# Altium footprint library tsl_Pcblib.PcbLib: 219 footprints (part 2 of 14)
Each footprint in its own frame and in the unit in brackets; x right, y up, seen from the top. Pads: shape width x height; smd on the part's side, far side on the other; paste and mask are expansions set on the pad; w line width, h text height; cw(c..) or ccw(c..) is an arc to the next point about the centre after c.
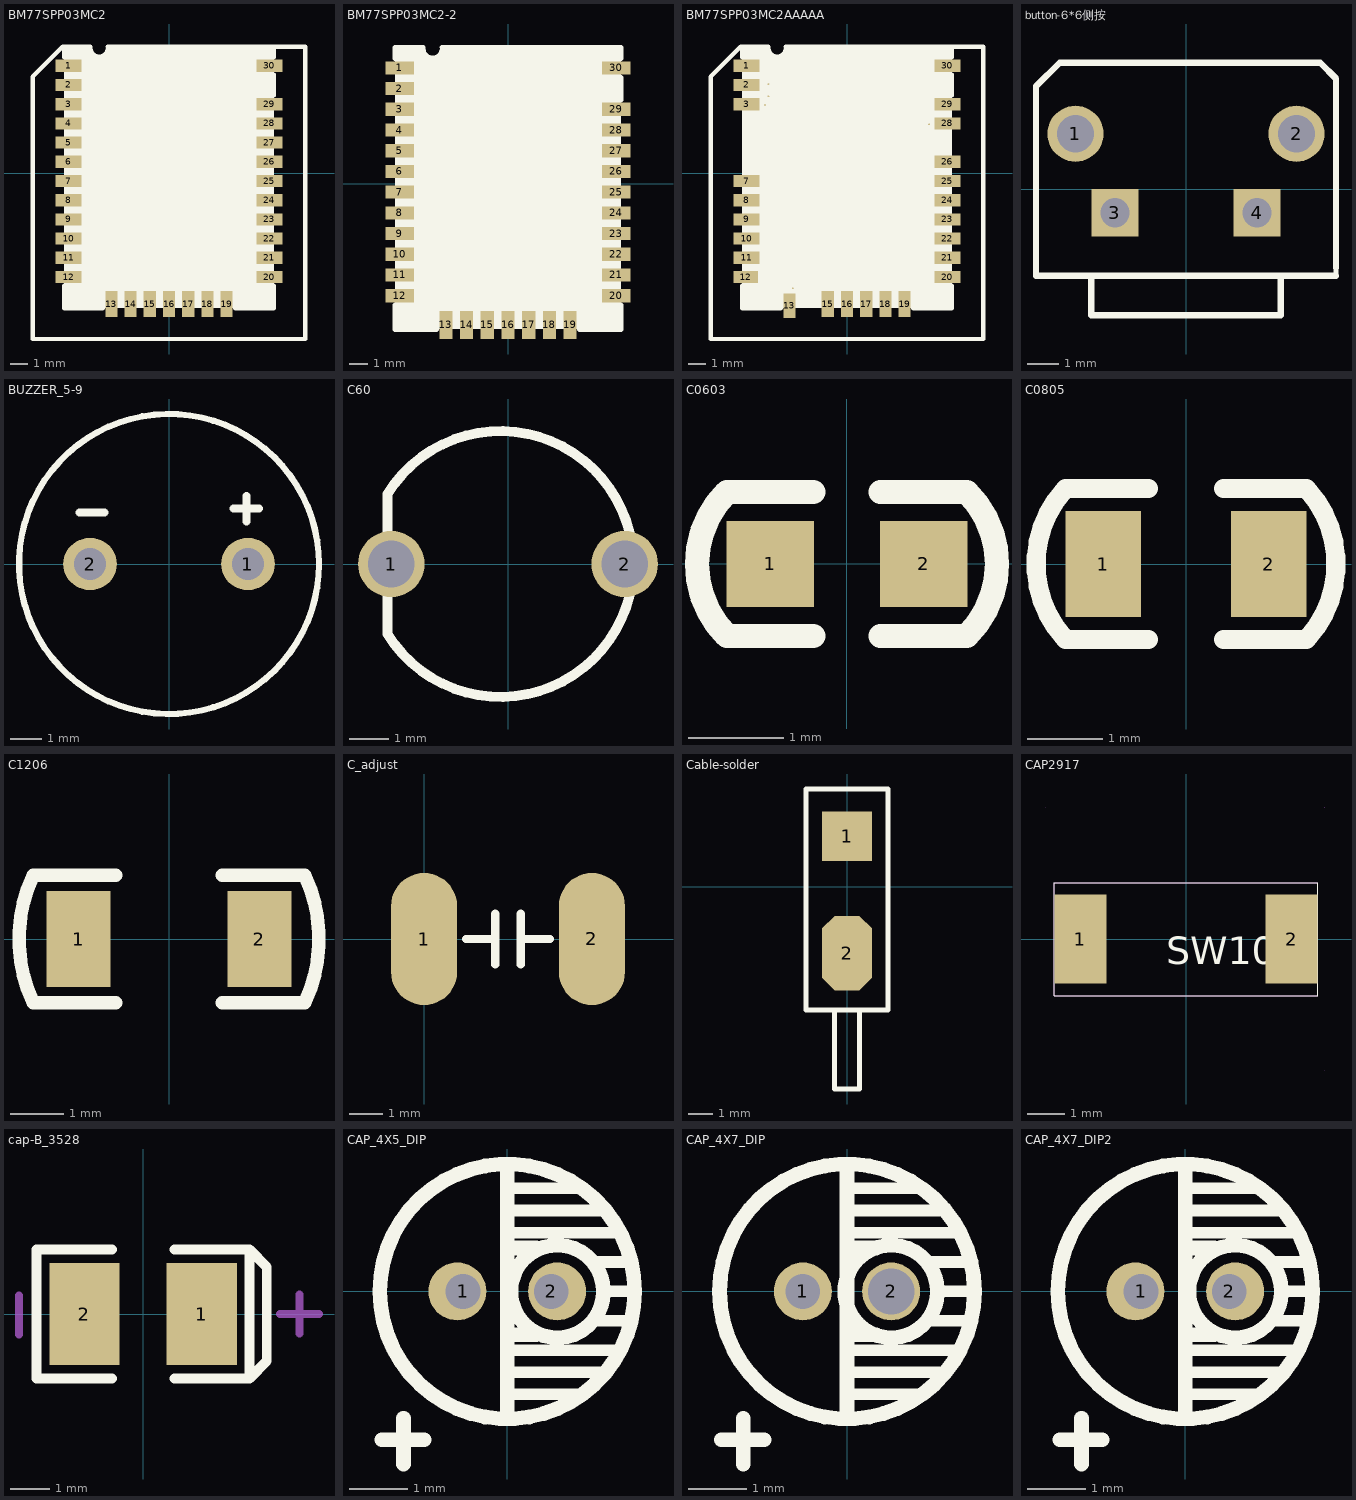
[diagram p1: the footprints below, top view; thin cyan lines are the x and y axes]

## BM77SPP03MC2 [mm]
pads (30):
  rect 1.5x0.7 smd: 1(-5.75,6.15) 2(-5.75,5.05) 3(-5.75,3.95) 4(-5.75,2.85) 5(-5.75,1.75) 6(-5.75,0.65) 7(-5.75,-0.45) 8(-5.75,-1.55) 9(-5.75,-2.65) 10(-5.75,-3.75) 11(-5.75,-4.85) 12(-5.75,-5.95) 20(5.75,-5.95) 21(5.75,-4.85) 22(5.75,-3.75) 23(5.75,-2.65) 24(5.75,-1.55) 25(5.75,-0.45) 26(5.75,0.65) 27(5.75,1.75) 28(5.75,2.85) 29(5.75,3.95) 30(5.75,6.15)
  rect 0.7x1.5 smd: 13(-3.3,-7.5) 14(-2.2,-7.5) 15(-1.1,-7.5) 16(0,-7.5) 17(1.1,-7.5) 18(2.2,-7.5) 19(3.3,-7.5)
Top Overlay:
  region: -6,7.3 -6,-7.7 6,-7.7 6,7.3 -3.496,7.301 -3.463,7.134 -3.504,6.928 -3.62,6.754 -3.794,6.637 -4,6.596 -4.206,6.637 -4.38,6.754 -4.496,6.928 -4.537,7.134 -4.504,7.301 -4.5,7.3
  lines w0.254: -6,-6.45 -6,-7.75 -3.8,-7.75 ; -6,6.65 -6,7.25 -4.5,7.25 ccw(c-4,7.18) -3.5,7.25 6,7.25 6,6.65 ; -5,7.25 -6.082,7.25 -7.8,5.532 -7.8,-9.5 7.8,-9.5 7.8,7.25 5,7.25 ; 3.8,-7.75 6,-7.75 6,-6.45 ; 6,4.45 6,5.65
3D body: height 2.2, standoff 0.2, extent -6.096,-7.747 6.223,7.113

## BM77SPP03MC2-2 [mm]
pads (30):
  rect 1.5x0.7 smd: 1(-5.75,6.15) 2(-5.75,5.05) 3(-5.75,3.95) 4(-5.75,2.85) 5(-5.75,1.75) 6(-5.75,0.65) 7(-5.75,-0.45) 8(-5.75,-1.55) 9(-5.75,-2.65) 10(-5.75,-3.75) 11(-5.75,-4.85) 12(-5.75,-5.95) 20(5.75,-5.95) 21(5.75,-4.85) 22(5.75,-3.75) 23(5.75,-2.65) 24(5.75,-1.55) 25(5.75,-0.45) 26(5.75,0.65) 27(5.75,1.75) 28(5.75,2.85) 29(5.75,3.95) 30(5.75,6.15)
  rect 0.7x1.5 smd: 13(-3.3,-7.5) 14(-2.2,-7.5) 15(-1.1,-7.5) 16(0,-7.5) 17(1.1,-7.5) 18(2.2,-7.5) 19(3.3,-7.5)
Top Overlay:
  region: -6,7.3 -6,-7.7 6,-7.7 6,7.3 -3.496,7.301 -3.463,7.134 -3.504,6.928 -3.62,6.754 -3.794,6.637 -4,6.596 -4.206,6.637 -4.38,6.754 -4.496,6.928 -4.537,7.134 -4.504,7.301 -4.5,7.3
  lines w0.254: -6,-6.45 -6,-7.75 -3.8,-7.75 ; -6,6.65 -6,7.25 -4.5,7.25 ccw(c-4,7.18) -3.5,7.25 6,7.25 6,6.65 ; 3.8,-7.75 6,-7.75 6,-6.45 ; 6,4.45 6,5.65
3D body: height 2.2, standoff 0.2, extent -6.096,-7.747 6.223,7.113

## BM77SPP03MC2AAAAA [mm]
pads (30):
  rect 1.5x0.7 smd: 1(-5.75,6.15) 2(-5.75,5.05) 3(-5.75,3.95) 7(-5.75,-0.45) 8(-5.75,-1.55) 9(-5.75,-2.65) 10(-5.75,-3.75) 11(-5.75,-4.85) 20(5.75,-5.95) 21(5.75,-4.85) 22(5.75,-3.75) 23(5.75,-2.65) 24(5.75,-1.55) 25(5.75,-0.45) 26(5.75,0.65) 28(5.75,2.85) 29(5.75,3.95) 30(5.75,6.15)
  round 0.1 smd: 4(-4.5,5.1) 5(-4.5,4.4) 6(-4.7,3.9) 14(-3.1,-6.6) 27(4.7,2.8)
  rect 1.4x0.7 smd: 12(-5.8,-5.95)
  rect 0.7x1.4 smd: 13(-3.3,-7.6)
  rect 0.7x1.5 smd: 15(-1.1,-7.5) 16(0,-7.5) 17(1.1,-7.5) 18(2.2,-7.5) 19(3.3,-7.5)
Top Overlay:
  region: -6,7.3 -6,-7.7 6,-7.7 6,7.3 -3.496,7.301 -3.463,7.134 -3.504,6.928 -3.62,6.754 -3.794,6.637 -4,6.596 -4.206,6.637 -4.38,6.754 -4.496,6.928 -4.537,7.134 -4.504,7.301 -4.5,7.3
  lines w0.254: -6,-6.45 -6,-7.75 -3.8,-7.75 ; -6,6.65 -6,7.25 -4.5,7.25 ccw(c-4,7.18) -3.5,7.25 6,7.25 6,6.65 ; -5,7.25 -6.082,7.25 -7.8,5.532 -7.8,-9.5 7.8,-9.5 7.8,7.25 5,7.25 ; 3.8,-7.75 6,-7.75 6,-6.45 ; 6,4.45 6,5.65
3D body: height 2.2, standoff 0.2, extent -6.096,-7.62 6.223,7.24

## button-6*6侧按 [mil] "SW385"
pads (4):
  round 71 / inner round 60 / far side round 71 hole 47: 1(-140,70) 2(140,70)
  rect 60x60 / inner round 60 / far side rect 60x60 hole 37: 3(-90,-30) 4(90,-30)
Top Overlay:
  lines w6: -130,-110 190,-110 190,140 170,160 -160,160 -190,130 -190,-110 -120,-110 -120,-160 120,-160 120,-110
  lines w8: -120,-110 -120,-160 120,-160 120,-110 ; 190,-110 -190,-110 -190,130 -160,160 170,160 190,140 190,-100
3D body "Grey Button Tactile Switch, SPST-NO 0.05 A-long.stp": height 291.34, standoff -137.8, extent -172.31,-360.19 162.33,128

## BUZZER_5-9 [mm]
pads (2):
  oval 1.7x1.651 hole 1.016: 1(2.5,0) 2(-2.5,0)
Top Overlay:
  circle w0.2: c0,0 r4.75
  lines w0.254: -2.84,1.63 -2.04,1.63 ; 2.05,1.75 2.85,1.75 ; 2.45,1.35 2.45,2.15
3D body "User Library-Buzzer_9mm.STEP": height 5.6, standoff -5.4, extent -4.55,-4.55 4.55,4.55

## C60 [mm]
pads (2):
  oval 1.71x1.7 / inner oval 1.71x1.7 / far side oval 2.1x2 hole 1.2: 1(-3,0) 2(3,0)
Top Overlay:
  lines w0.254: -3.1,-1.8 ccw(c-0.196,0) -3.1,1.8 ; -3.1,-1.8 -3.1,1.8

## C0603 [mm]
pads (2):
  rect 0.91x0.9 smd: 1(-0.8,0) 2(0.8,0)
Top Overlay:
  lines w0.254: -0.35,-0.75 -1.25,-0.75 cw(c-0.505,0) -1.25,0.75 -0.35,0.75 ; 0.35,-0.75 1.25,-0.75 ccw(c0.513,0) 1.25,0.75 0.35,0.75
3D body "User Library-0603 SMD Capacitor.STEP": height 0.3, standoff 0, extent -0.8,-0.4 0.8,0.4

## C0805 [mm]
pads (2):
  rect 1x1.4 smd: 1(-1.1,0) 2(1.1,0)
Top Overlay:
  lines w0.254: -0.5,-1 -1.6,-1 cw(c-0.513,0) -1.6,1 -0.5,1 ; 0.5,-1 1.6,-1 ccw(c0.513,0) 1.6,1 0.5,1
3D body "User Library-0805 SMD Capacitor.STEP": height 0.77, standoff -0.01, extent -0.999,-0.625 1.001,0.625

## C1206 [mm]
pads (2):
  rect 1.2x1.8 smd: 1(-1.7,0) 2(1.7,0)
Top Overlay:
  lines w0.25: -2.55,-1.2 -1,-1.2 ; -2.55,1.2 -1,1.2 ; 1,-1.2 2.55,-1.2 ; 1,1.2 2.55,1.2
  lines w0.254: -2.55,-1.2 cw(c0,0) -2.55,1.2 ; 2.55,-1.2 ccw(c0,0) 2.55,1.2
3D body "C1206.STEP": height 1, standoff 0, extent -1.602,-0.813 1.598,0.787

## C_adjust [mm]
pads (2):
  oval 2x4 smd: 1(0,0) 2(5.08,0)
Top Overlay:
  lines w0.254: 1.27,0 2.043,0 ; 2.159,-0.773 2.159,0.762 ; 2.921,-0.773 2.921,0.762 ; 3.037,0 3.81,0

## Cable-solder [mm]
pads (2):
  rect 2x2 smd: 1(0,2.032)
  oct 2x3 smd: 2(0,-2.667)
Top Overlay:
  lines w0.203: -0.508,-4.953 -0.508,-8.128 0.508,-8.128 0.508,-4.953 0.635,-4.953 ; -1.143,3.937 -1.143,3.937 ; -1.143,3.937 -1.651,3.937 -1.651,-4.953 1.651,-4.953 1.651,3.937 -1.143,3.937

## CAP2917 [mm]
pads (2):
  rect 1.4x2.4 smd paste-0.05 mask+0.05: 1(-2.85,0) 2(2.85,0)
Top Overlay:
  lines w0.025: -3.556,-1.524 -3.556,1.524 3.556,1.524 3.556,-1.524 -3.556,-1.524
  text "SW10" at -0.535,-0.676 h0.75
Mechanical 1:
  lines w0.025: -3.556,-1.524 -3.556,1.524 3.556,1.524 3.556,-1.524 -3.556,-1.524
Mechanical 20:
  lines w0.025: -3.785,3.556 -3.784,3.556 ; 3.734,3.55 3.735,3.55 ; 3.75,-3.55 3.751,-3.55 ; 3.75,3.55 3.751,3.55

## cap-B_3528 [mm]
pads (2):
  rect 1.8x2.6 smd: 1(1.5,0) 2(-1.5,0)
Top Overlay:
  lines w0.254: -0.8,-1.65 -2.727,-1.65 -2.727,1.65 -0.8,1.65 ; 0.8,-1.65 2.727,-1.65 ; 0.8,1.65 2.727,1.65 ; 2.727,-1.65 2.727,1.65 ; 2.727,-1.65 3.163,-1.2 3.163,1.2 2.727,1.65
Mechanical 15:
  lines w0.203: -3.175,-0.525 -3.175,0.475 ; 3.5,0 4.5,0 ; 4,-0.5 4,0.5
3D body "User Library-AVX_BCASE.STEP": height 2.03, standoff 0, extent -1.85,-1.465 1.85,1.465

## CAP_4X5_DIP [mm]
pads (2):
  round 1 hole 0.6 copper offset -0.1,0: 1(-0.762,0)
  round 1 hole 0.6 copper offset 0.1,0: 2(0.762,0)
Top Overlay:
  circle w0.254: c0.862,0 r0.8
  circle w0.254: c0,0 r2.2
  lines w0.2: 0,-1.778 1.27,-1.778 ; 0,-1.397 1.651,-1.397 ; 0,-1.016 1.905,-1.016 ; 0,1.016 1.905,1.016 ; 0,1.397 1.651,1.397 ; 0,1.778 1.27,1.778 ; 1.524,-0.508 2.159,-0.508 ; 1.524,0.508 2.159,0.508 ; 1.689,0 2.227,0
  lines w0.254: -2.167,-2.562 -1.43,-2.562 ; -1.792,-2.979 -1.792,-2.192 ; 0,-2.159 0,2.159 ; 0,-0.75 0.5,-0.75 ; 0,0.75 0.5,0.75
Bottom Overlay:
  rectangle: -0.254,-0.762 0.254,0.762
3D body "User Library-Cap electrolitic radial 4x5.STEP": height 5.2, standoff -1.3, extent -1.999,-2 1.999,2

## CAP_4X7_DIP [mm]
pads (2):
  round 1 hole 0.6: 1(-0.762,0)
  round 1 hole 0.8: 2(0.762,0)
Top Overlay:
  circle w0.254: c0.762,0 r0.8
  circle w0.254: c0,0 r2.2
  lines w0.2: 0,-1.778 1.27,-1.778 ; 0,-1.397 1.651,-1.397 ; 0,-1.016 1.905,-1.016 ; 0,1.016 1.905,1.016 ; 0,1.397 1.651,1.397 ; 0,1.778 1.27,1.778 ; 1.397,-0.508 2.159,-0.508 ; 1.397,0.508 2.159,0.508 ; 1.562,0 2.2,0
  lines w0.254: -2.167,-2.562 -1.43,-2.562 ; -1.792,-2.979 -1.792,-2.192 ; 0,-2.159 0,2.159 ; 0,-0.75 0.5,-0.75 ; 0,0.75 0.5,0.75

## CAP_4X7_DIP2 [mm]
pads (2):
  round 1 hole 0.6 copper offset -0.1,0: 1(-0.762,0)
  round 1 hole 0.6 copper offset 0.1,0: 2(0.762,0)
Top Overlay:
  circle w0.254: c0.862,0 r0.8
  circle w0.254: c0,0 r2.2
  lines w0.2: 0,-1.778 1.27,-1.778 ; 0,-1.397 1.651,-1.397 ; 0,-1.016 1.905,-1.016 ; 0,1.016 1.905,1.016 ; 0,1.397 1.651,1.397 ; 0,1.778 1.27,1.778 ; 1.524,-0.508 2.159,-0.508 ; 1.524,0.508 2.159,0.508 ; 1.689,0 2.227,0
  lines w0.254: -2.167,-2.562 -1.43,-2.562 ; -1.792,-2.979 -1.792,-2.192 ; 0,-2.159 0,2.159 ; 0,-0.75 0.5,-0.75 ; 0,0.75 0.5,0.75
Bottom Overlay:
  rectangle: -0.254,-0.762 0.254,0.762
3D body: height 7, standoff 0, extent -2,-1.999 2,1.999